# Altium footprint library 3D_MIG_Controller.PCBLIB: 560 footprints (part 25 of 35)
Each footprint in its own frame and in the unit in brackets; x right, y up, seen from the top. Pads: shape width x height; smd on the part's side, far side on the other; paste and mask are expansions set on the pad; w line width, h text height; cw(c..) or ccw(c..) is an arc to the next point about the centre after c.
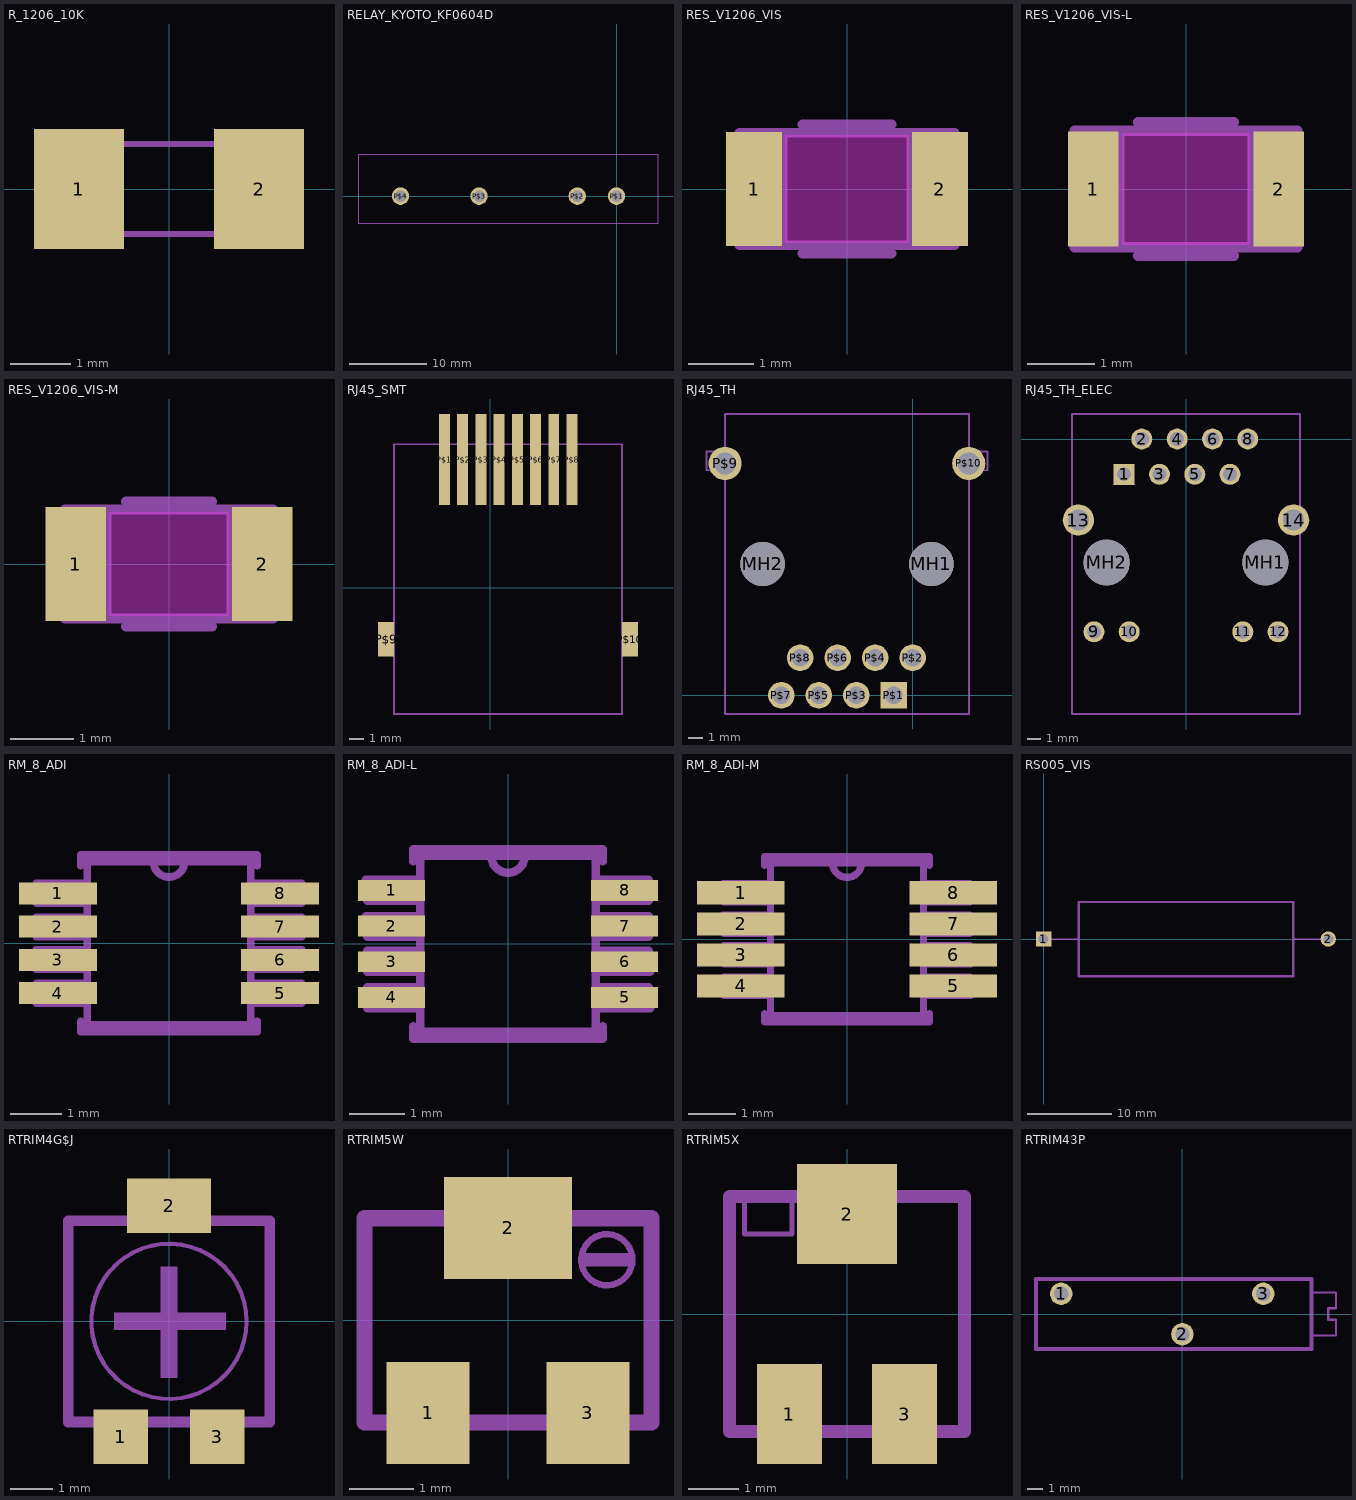
[diagram p24: the footprints below, top view; thin cyan lines are the x and y axes]

## R_1206_10K [mm]
pads (2):
  rect 1.5x2 smd: 1(-1.5,0) 2(1.5,0)
tDocu:
  region: -1.6,-0.8 -1.6,0.8 -1.1,0.8 -1.1,-0.8
  region: 1.1,-0.8 1.1,0.8 1.6,0.8 1.6,-0.8
  lines w0.102: -1.525,-0.75 1.525,-0.75 ; -1.525,0.75 1.525,0.75
tValues:
  text "10K" at -1.6,-2.1 h0.59

## RELAY_KYOTO_KF0604D [mil]
pads (4):
  round 88.59 hole 59.06: P$1(0,0) P$2(-200,0) P$3(-700,0) P$4(-1100,0)
tPlace:
  lines w5: -1316.54,-137.8 -1316.54,210.63 211.02,210.63 211.02,-137.8 -1316.54,-137.8

## RES_V1206_VIS [mil]
pads (2):
  rect 33.59x68.9 smd: 1(-56.17,0) 2(56.17,0)
Top keep-out:
  region: -37.37,32.45 37.37,32.45 37.37,-32.45 -37.37,-32.45
tDocu:
  lines w6: -39,-34 -39,34 ; -39,-34 -65,-34 -65,34 -39,34 ; -39,-34 39,-34 ; -39,34 39,34 ; 39,-34 39,34 ; 39,-34 65,-34 65,34 39,34
tPlace:
  lines w6: -27,-39 27,-39 ; -27,39 27,39

## RES_V1206_VIS-L [mil]
pads (2):
  rect 29.59x66.9 smd: 1(-54.17,0) 2(54.17,0)
Top keep-out:
  region: -37.37,32.45 37.37,32.45 37.37,-32.45 -37.37,-32.45
tDocu:
  lines w6: -39,-34 -39,34 ; -39,-34 -65,-34 -65,34 -39,34 ; -39,-34 39,-34 ; -39,34 39,34 ; 39,-34 39,34 ; 39,-34 65,-34 65,34 39,34
tPlace:
  lines w6: -28,-39 28,-39 ; -28,39 28,39

## RES_V1206_VIS-M [mil]
pads (2):
  rect 37.59x70.9 smd: 1(-58.17,0) 2(58.17,0)
Top keep-out:
  region: -37.37,32.45 37.37,32.45 37.37,-32.45 -37.37,-32.45
tDocu:
  lines w6: -39,-34 -39,34 ; -39,-34 -65,-34 -65,34 -39,34 ; -39,-34 39,-34 ; -39,34 39,34 ; 39,-34 39,34 ; 39,-34 65,-34 65,34 39,34
tPlace:
  lines w6: -27,-39 27,-39 ; -27,39 27,39

## RJ45_SMT [mil]
pads (10):
  rect 29.92x250 smd: P$1(-125.2,351.97) P$2(-75.2,351.97) P$3(-25.2,351.97) P$4(24.8,351.97) P$5(74.8,351.97) P$6(124.8,351.97) P$7(174.8,351.97) P$8(224.8,351.97)
  rect 43.31x94.49 smd: P$9(-285.43,-141.73) P$10(383.86,-141.73)
tDocu:
  lines w5: -263.78,-346.46 362.2,-346.46 362.2,393.7 -263.78,393.7 -263.78,-346.46

## RJ45_TH [mm]
pads (12):
  round 3 hole 3 unplated: MH1(1.27,8.89) MH2(-10.16,8.89)
  rect 1.8x1.8 / inner round 1.663 / far side rect 1.8x1.8 hole 1.2: P$1(-1.27,0)
  round 1.8 hole 1.2: P$2(0,2.54) P$3(-3.81,0) P$4(-2.54,2.54) P$5(-6.35,0) P$6(-5.08,2.54) P$7(-8.89,0) P$8(-7.62,2.54)
  round 2.25 hole 1.5: P$9(-12.7,15.7) P$10(3.8,15.7)
tPlace:
  lines w0.127: -12.7,15.24 -12.7,16.51 ; -12.7,15.24 -12.7,-1.27 3.81,-1.27 3.81,15.24 ; -12.7,15.24 -13.97,15.24 -13.97,16.51 -12.7,16.51 ; -12.7,16.51 -12.7,19.05 3.81,19.05 3.81,16.51 ; 3.81,15.24 3.81,16.51 ; 3.81,15.24 5.08,15.24 5.08,16.51 3.81,16.51

## RJ45_TH_ELEC [mm]
pads (16):
  rect 1.508x1.508 / inner round 1.393 / far side rect 1.508x1.508 hole 1: 1(-4.45,-2.54)
  round 1.508 hole 1: 2(-3.18,0) 3(-1.91,-2.54) 4(-0.635,0) 5(0.635,-2.54) 6(1.91,0) 7(3.17,-2.54) 8(4.445,0) 9(-6.63,-13.88) 10(-4.09,-13.88) 11(4.09,-13.88) 12(6.63,-13.88)
  round 2.25 hole 1.5: 13(-7.75,-5.84) 14(7.75,-5.84)
  round 3.299 hole 3.299 unplated: MH1(5.715,-8.89) MH2(-5.715,-8.89)
tPlace:
  lines w0.127: -8.2,-19.8 -8.2,1.8 8.2,1.8 8.2,-19.8 -8.2,-19.8

## RM_8_ADI [mil]
pads (8):
  rect 60x17 smd: 1(-85.5,38.39) 2(-85.5,12.8) 3(-85.5,-12.8) 4(-85.5,-38.39) 5(85.5,-38.39) 6(85.5,-12.8) 7(85.5,12.8) 8(85.5,38.39)
tDocu:
  lines w6: -12,63 12,63 ; -12,63 -63,63 -63,-63 63,-63 63,63 12,63 ; -12,63 ccw(c0,63) 12,63 ; -102,-46 -102,-31 -63,-31 -63,-46 -102,-46 ; -102,-20 -102,-5 -63,-5 -63,-20 -102,-20 ; -102,5 -102,20 -63,20 -63,5 -102,5 ; -102,31 -102,46 -63,46 -63,31 -102,31 ; 63,-46 63,-31 102,-31 102,-46 63,-46 ; 63,-20 63,-5 102,-5 102,-20 63,-20 ; 63,5 63,20 102,20 102,5 63,5 ; 63,31 63,46 102,46 102,31 63,31
  text "*" at -71,10 h77.5
tPlace:
  lines w6: -68,-60 -68,-68 68,-68 68,-60 ; -68,60 -68,68 68,68 68,60
  text "*" at -118,50 h77.5

## RM_8_ADI-L [mil]
pads (8):
  rect 48x15 smd: 1(-83.5,38.39) 2(-83.5,12.8) 3(-83.5,-12.8) 4(-83.5,-38.39) 5(83.5,-38.39) 6(83.5,-12.8) 7(83.5,12.8) 8(83.5,38.39)
tDocu:
  lines w6: -12,63 12,63 ; -12,63 -63,63 -63,-63 63,-63 63,63 12,63 ; -12,63 ccw(c0,63) 12,63 ; -102,20 -63,20 -63,5 -101,5 -102,20 ; -102,46 -63,46 -63,31 -101,31 -102,46 ; -101,-46 -101,-31 -63,-31 -63,-46 -101,-46 ; -101,-20 -101,-5 -63,-5 -63,-20 -101,-20 ; 63,-46 63,-31 101,-31 102,-46 63,-46 ; 63,-20 63,-5 101,-5 102,-20 63,-20 ; 63,5 63,20 101,20 101,5 63,5 ; 63,31 63,46 101,46 101,31 63,31
  text "*" at -71,10 h77.5
tPlace:
  lines w6: -68,-59 -68,-68 68,-68 68,-59 ; -68,59 -68,68 68,68 68,59
  text "*" at -116,48 h77.5

## RM_8_ADI-M [mil]
pads (8):
  rect 72x19 smd: 1(-87.5,38.39) 2(-87.5,12.8) 3(-87.5,-12.8) 4(-87.5,-38.39) 5(87.5,-38.39) 6(87.5,-12.8) 7(87.5,12.8) 8(87.5,38.39)
tDocu:
  lines w6: -12,63 12,63 ; -12,63 -63,63 -63,-63 63,-63 63,63 12,63 ; -12,63 ccw(c0,63) 12,63 ; -102,20 -63,20 -63,5 -101,5 -102,20 ; -102,46 -63,46 -63,31 -101,31 -102,46 ; -101,-46 -101,-31 -63,-31 -63,-46 -101,-46 ; -101,-20 -101,-5 -63,-5 -63,-20 -101,-20 ; 63,-46 63,-31 101,-31 102,-46 63,-46 ; 63,-20 63,-5 101,-5 102,-20 63,-20 ; 63,5 63,20 101,20 101,5 63,5 ; 63,31 63,46 101,46 101,31 63,31
  text "*" at -71,10 h77.5
tPlace:
  lines w6: -68,-61 -68,-68 68,-68 68,-61 ; -68,61 -68,68 68,68 68,61
  text "*" at -120,52 h77.5

## RS005_VIS [mil]
pads (2):
  rect 72x72 / inner round 66.52 / far side rect 72x72 hole 47.24: 1(0,0)
  round 72 hole 47.24: 2(1336,0)
tDocu:
  lines w6: 0,0 168,0 ; 1168,0 1336,0 ; 168,-172 1168,-172 1168,172 168,172 168,-172
tPlace:
  lines w6: 163,-176 1173,-176 1173,176 163,176 163,-176

## RTRIM4G$J [mm]
pads (3):
  rect 1.3x1.3 smd: 1(-1.15,-2.75) 3(1.15,-2.75)
  rect 2x1.3 smd: 2(0,2.75)
tDocu:
  lines w0.254: -2.4,-2.4 -2.4,2.4 2.4,2.4 2.4,-2.4 -2.4,-2.4
tPlace:
  circle w0.102: c0,0 r1.85
  region: -1.3,-0.2 -1.3,0.2 1.35,0.2 1.35,-0.2
  region: -0.2,-1.35 -0.2,1.3 0.2,1.3 0.2,-1.35
  lines w0.254: -2.1,-2.4 -2.4,-2.4 -2.4,2.4 -1.25,2.4 ; -0.25,-2.4 0.25,-2.4 ; 1.25,2.4 2.4,2.4 2.4,-2.4 2,-2.4

## RTRIM5W [mm]
pads (3):
  rect 1.3x1.6 smd: 1(-1.25,-1.45) 3(1.25,-1.45)
  rect 2x1.6 smd: 2(0,1.45)
tDocu:
  lines w0.254: -2.25,-1.6 -2.25,1.6 2.25,1.6 2.25,-1.6 -2.25,-1.6
tPlace:
  circle w0.102: c1.55,0.95 r0.4
  region: 1.15,0.85 1.15,1.05 1.95,1.05 1.95,0.85
  lines w0.254: -2.25,-1.6 -2.25,1.6 -1.25,1.6 ; -0.3,-1.6 0.3,-1.6 ; 1.25,1.6 2.25,1.6 2.25,-1.6

## RTRIM5X [mm]
pads (3):
  rect 1.3x2 smd: 1(-1.15,-2) 3(1.15,-2)
  rect 2x2 smd: 2(0,2)
tDocu:
  lines w0.254: -2.35,-2.35 -2.35,2.35 2.35,2.35 2.35,-2.35 -2.35,-2.35
tPlace:
  lines w0.102: -2.05,2.25 -2.05,1.6 -1.1,1.6 -1.1,2.25
  lines w0.254: -2.05,-2.35 -2.35,-2.35 -2.35,2.35 -1.25,2.35 ; -0.25,-2.35 0.25,-2.35 ; 1.25,2.35 2.35,2.35 2.35,-2.35 2.05,-2.35

## RTRIM43P [mil]
pads (3):
  round 55.43 hole 35.43: 1(-300,50) 2(0,-50) 3(200,50)
tPlace:
  lines w6: 322.83,-53.15 379.92,-53.15 379.92,-13.78 360.24,-13.78 360.24,13.78 379.92,13.78 379.92,53.15 322.83,53.15
  lines w10: -362.2,-86.61 -362.2,86.61 318.9,86.61 318.9,-86.61 -362.2,-86.61